# Altium schematic symbol library TI Amplifiers and Linear Special Function Amplifier.SchLib: 708 symbols (part 4 of 34) (continued)
## OPA569AIDWP
designator U?
Power Op Amp, Output Signal Swings within 200 mV of Rails at 2 A Output Current, -55 to 125 degC, 20-pin SOP (DWP20), Green (RoHS & no Sb/Br); Manufacturer: Texas Instruments; PartNumber: OPA569AIDWP; Iq(Max)(mA): 6; Vs(Max)(V): 5.5; Vs(Min)(V): 2.7; DatasheetVersion: SBOS264A; PackageVersion: 4147575/C, 02/2005; PackageReference: DWP20-3905X3265TP; PackageDescription: 20-Pin PowerPAD(TM) Plastic Small-Outline Package, Body 12.825 x 7.52 mm, Pitch 1.27 mm; Supplier 1: Digi-Key; Supplier Part Number 1: 296-14174-5-ND; Supplier 2: Farnell; Supplier Part Number 2: 1470363; Supplier 3: Mouser; Supplier Part Number 3: 595-OPA569AIDWP; Eco-Plan: Green (RoHS & no Sb/Br); Mounting Technology: Surface Mount; ComponentLink1Description: Manufacturer URL; ComponentLink1URL: http://www.ti.com/; ComponentLink2Description: Datasheet; ComponentLink2URL: http://www.ti.com/general/docs/lit/getliterature.tsp?genericPartNumber=OPA569&fileType=pdf; ComponentLink3Description: Package Specification; ComponentLink3URL: http://www.ti.com/litv/pdf/mpds032b
footprint TI-DWP20-3905X3265TP_N (SOP, 20-Leads, Body 12.83x7.52mm, Pitch 1.27mm, Thermal Pad 4.32x3.81mm, IPC Medium Density)
footprint TI-DWP20-3905X3265TP_L (SOP, 20-Leads, Body 12.83x7.52mm, Pitch 1.27mm, Thermal Pad 4.32x3.81mm, IPC High Density)
footprint TI-DWP20-3905X3265TP_M (SOP, 20-Leads, Body 12.83x7.52mm, Pitch 1.27mm, Thermal Pad 4.32x3.81mm, IPC Low Density)
pins: 1 PowerPAD (power) "PowerPAD Connection Pins.", 2 PARALLEL OUT 1 (hiz) "Connection for Paralleling Multiple Amplifiers", 3 CURRENT LIMIT SET (in) "Current Limit Set Pin", 4 ~{CURRENT LIMIT FLAG} (out) "Indicates When Part is in Current Limit (Active LOW).", 5 -IN (in) "Inverting Input", 6 +IN (in) "Noninverting Input", 7 ~{THERMAL FLAG} (out) "Indicates Thermal Stress (Active LOW)", 8 ENABLE (in) "Enabled HIGH. Shut down LOW.", 9 PARALLEL OUT 2 (hiz) "Connection for Paralleling Multiple Amplifiers", 10 PowerPAD (power) "PowerPAD Connection Pins", 11 PowerPAD (power) "PowerPAD Connection Pins", 12 V+ (power) "Positive Power-Supply Voltage", 13 V+ (power) "Positive Power-Supply Voltage", 14 VO (hiz) "Output", 15 VO (hiz) "Output", 16 NC "No Internal Connection", 17 V- (power) "Negative Power-Supply Voltage", 18 V- (power) "Negative Power-Supply Voltage", 19 IMONITOR (in) "Provides 1:475 Bidirectional Copy of Output Current.", 20 PowerPAD (power) "PowerPAD Connection Pins", 21 EP "Exposed pad."

## OPA569AIDWPG4
designator U?
Power Op Amp, Output Signal Swings within 200 mV of Rails at 2 A Output Current, -55 to 125 degC, 20-pin SOP (DWP20), Green (RoHS & no Sb/Br); Manufacturer: Texas Instruments; PartNumber: OPA569AIDWPG4; Iq(Max)(mA): 6; Vs(Max)(V): 5.5; Vs(Min)(V): 2.7; DatasheetVersion: SBOS264A; PackageVersion: 4147575/C, 02/2005; PackageReference: DWP20-3905X3265TP; PackageDescription: 20-Pin PowerPAD(TM) Plastic Small-Outline Package, Body 12.825 x 7.52 mm, Pitch 1.27 mm; Supplier 1: Digi-Key; Supplier Part Number 1: OPA569AIDWPG4-ND; Supplier 2: Farnell; Supplier Part Number 2: 1234786; Supplier 3: Mouser; Supplier Part Number 3: 595-OPA569AIDWPG4; Eco-Plan: Green (RoHS & no Sb/Br); Mounting Technology: Surface Mount; ComponentLink1Description: Manufacturer URL; ComponentLink1URL: http://www.ti.com/; ComponentLink2Description: Datasheet; ComponentLink2URL: http://www.ti.com/general/docs/lit/getliterature.tsp?genericPartNumber=OPA569&fileType=pdf; ComponentLink3Description: Package Specification; ComponentLink3URL: http://www.ti.com/litv/pdf/mpds032b
footprint TI-DWP20-3905X3265TP_N (SOP, 20-Leads, Body 12.83x7.52mm, Pitch 1.27mm, Thermal Pad 4.32x3.81mm, IPC Medium Density)
footprint TI-DWP20-3905X3265TP_L (SOP, 20-Leads, Body 12.83x7.52mm, Pitch 1.27mm, Thermal Pad 4.32x3.81mm, IPC High Density)
footprint TI-DWP20-3905X3265TP_M (SOP, 20-Leads, Body 12.83x7.52mm, Pitch 1.27mm, Thermal Pad 4.32x3.81mm, IPC Low Density)
pins: 1 PowerPAD (power) "PowerPAD Connection Pins.", 2 PARALLEL OUT 1 (hiz) "Connection for Paralleling Multiple Amplifiers", 3 CURRENT LIMIT SET (in) "Current Limit Set Pin", 4 ~{CURRENT LIMIT FLAG} (out) "Indicates When Part is in Current Limit (Active LOW).", 5 -IN (in) "Inverting Input", 6 +IN (in) "Noninverting Input", 7 ~{THERMAL FLAG} (out) "Indicates Thermal Stress (Active LOW)", 8 ENABLE (in) "Enabled HIGH. Shut down LOW.", 9 PARALLEL OUT 2 (hiz) "Connection for Paralleling Multiple Amplifiers", 10 PowerPAD (power) "PowerPAD Connection Pins", 11 PowerPAD (power) "PowerPAD Connection Pins", 12 V+ (power) "Positive Power-Supply Voltage", 13 V+ (power) "Positive Power-Supply Voltage", 14 VO (hiz) "Output", 15 VO (hiz) "Output", 16 NC "No Internal Connection", 17 V- (power) "Negative Power-Supply Voltage", 18 V- (power) "Negative Power-Supply Voltage", 19 IMONITOR (in) "Provides 1:475 Bidirectional Copy of Output Current.", 20 PowerPAD (power) "PowerPAD Connection Pins", 21 EP "Exposed pad."

## OPA569AIDWPR
designator U?
Power Op Amp, Output Signal Swings within 200 mV of Rails at 2 A Output Current, -55 to 125 degC, 20-pin SOP (DWP20), Green (RoHS & no Sb/Br); Manufacturer: Texas Instruments; PartNumber: OPA569AIDWPR; Iq(Max)(mA): 6; Vs(Max)(V): 5.5; Vs(Min)(V): 2.7; DatasheetVersion: SBOS264A; PackageVersion: 4147575/C, 02/2005; PackageReference: DWP20-3905X3265TP; PackageDescription: 20-Pin PowerPAD(TM) Plastic Small-Outline Package, Body 12.825 x 7.52 mm, Pitch 1.27 mm; Supplier 1: Digi-Key; Supplier Part Number 1: 296-26292-2-ND; Supplier 2: Digi-Key; Supplier Part Number 2: 296-26292-1-ND; Supplier 3: Digi-Key; Supplier Part Number 3: 296-26292-6-ND; Supplier 4: Newark; Supplier Part Number 4: 21H3993; Supplier 5: Mouser; Supplier Part Number 5: 595-OPA569AIDWPR; Eco-Plan: Green (RoHS & no Sb/Br); Mounting Technology: Surface Mount; ComponentLink1Description: Manufacturer URL; ComponentLink1URL: http://www.ti.com/; ComponentLink2Description: Datasheet; ComponentLink2URL: http://www.ti.com/general/docs/lit/getliterature.tsp?genericPartNumber=OPA569&fileType=pdf; ComponentLink3Description: Package Specification; ComponentLink3URL: http://www.ti.com/litv/pdf/mpds032b
footprint TI-DWP20-3905X3265TP_N (SOP, 20-Leads, Body 12.83x7.52mm, Pitch 1.27mm, Thermal Pad 4.32x3.81mm, IPC Medium Density)
footprint TI-DWP20-3905X3265TP_L (SOP, 20-Leads, Body 12.83x7.52mm, Pitch 1.27mm, Thermal Pad 4.32x3.81mm, IPC High Density)
footprint TI-DWP20-3905X3265TP_M (SOP, 20-Leads, Body 12.83x7.52mm, Pitch 1.27mm, Thermal Pad 4.32x3.81mm, IPC Low Density)
pins: 1 PowerPAD (power) "PowerPAD Connection Pins.", 2 PARALLEL OUT 1 (hiz) "Connection for Paralleling Multiple Amplifiers", 3 CURRENT LIMIT SET (in) "Current Limit Set Pin", 4 ~{CURRENT LIMIT FLAG} (out) "Indicates When Part is in Current Limit (Active LOW).", 5 -IN (in) "Inverting Input", 6 +IN (in) "Noninverting Input", 7 ~{THERMAL FLAG} (out) "Indicates Thermal Stress (Active LOW)", 8 ENABLE (in) "Enabled HIGH. Shut down LOW.", 9 PARALLEL OUT 2 (hiz) "Connection for Paralleling Multiple Amplifiers", 10 PowerPAD (power) "PowerPAD Connection Pins", 11 PowerPAD (power) "PowerPAD Connection Pins", 12 V+ (power) "Positive Power-Supply Voltage", 13 V+ (power) "Positive Power-Supply Voltage", 14 VO (hiz) "Output", 15 VO (hiz) "Output", 16 NC "No Internal Connection", 17 V- (power) "Negative Power-Supply Voltage", 18 V- (power) "Negative Power-Supply Voltage", 19 IMONITOR (in) "Provides 1:475 Bidirectional Copy of Output Current.", 20 PowerPAD (power) "PowerPAD Connection Pins", 21 EP "Exposed pad."

## OPA569AIDWPRG4
designator U?
Power Op Amp, Output Signal Swings within 200 mV of Rails at 2 A Output Current, -55 to 125 degC, 20-pin SOP (DWP20), Green (RoHS & no Sb/Br); Manufacturer: Texas Instruments; PartNumber: OPA569AIDWPRG4; Iq(Max)(mA): 6; Vs(Max)(V): 5.5; Vs(Min)(V): 2.7; DatasheetVersion: SBOS264A; PackageVersion: 4147575/C, 02/2005; PackageReference: DWP20-3905X3265TP; PackageDescription: 20-Pin PowerPAD(TM) Plastic Small-Outline Package, Body 12.825 x 7.52 mm, Pitch 1.27 mm; Supplier 1: Digi-Key; Supplier Part Number 1: OPA569AIDWPRG4-ND; Supplier 2: Mouser; Supplier Part Number 2: 595-OPA569AIDWPRG4; Eco-Plan: Green (RoHS & no Sb/Br); Mounting Technology: Surface Mount; ComponentLink1Description: Manufacturer URL; ComponentLink1URL: http://www.ti.com/; ComponentLink2Description: Datasheet; ComponentLink2URL: http://www.ti.com/general/docs/lit/getliterature.tsp?genericPartNumber=OPA569&fileType=pdf; ComponentLink3Description: Package Specification; ComponentLink3URL: http://www.ti.com/litv/pdf/mpds032b
footprint TI-DWP20-3905X3265TP_N (SOP, 20-Leads, Body 12.83x7.52mm, Pitch 1.27mm, Thermal Pad 4.32x3.81mm, IPC Medium Density)
footprint TI-DWP20-3905X3265TP_L (SOP, 20-Leads, Body 12.83x7.52mm, Pitch 1.27mm, Thermal Pad 4.32x3.81mm, IPC High Density)
footprint TI-DWP20-3905X3265TP_M (SOP, 20-Leads, Body 12.83x7.52mm, Pitch 1.27mm, Thermal Pad 4.32x3.81mm, IPC Low Density)
pins: 1 PowerPAD (power) "PowerPAD Connection Pins.", 2 PARALLEL OUT 1 (hiz) "Connection for Paralleling Multiple Amplifiers", 3 CURRENT LIMIT SET (in) "Current Limit Set Pin", 4 ~{CURRENT LIMIT FLAG} (out) "Indicates When Part is in Current Limit (Active LOW).", 5 -IN (in) "Inverting Input", 6 +IN (in) "Noninverting Input", 7 ~{THERMAL FLAG} (out) "Indicates Thermal Stress (Active LOW)", 8 ENABLE (in) "Enabled HIGH. Shut down LOW.", 9 PARALLEL OUT 2 (hiz) "Connection for Paralleling Multiple Amplifiers", 10 PowerPAD (power) "PowerPAD Connection Pins", 11 PowerPAD (power) "PowerPAD Connection Pins", 12 V+ (power) "Positive Power-Supply Voltage", 13 V+ (power) "Positive Power-Supply Voltage", 14 VO (hiz) "Output", 15 VO (hiz) "Output", 16 NC "No Internal Connection", 17 V- (power) "Negative Power-Supply Voltage", 18 V- (power) "Negative Power-Supply Voltage", 19 IMONITOR (in) "Provides 1:475 Bidirectional Copy of Output Current.", 20 PowerPAD (power) "PowerPAD Connection Pins", 21 EP "Exposed pad."

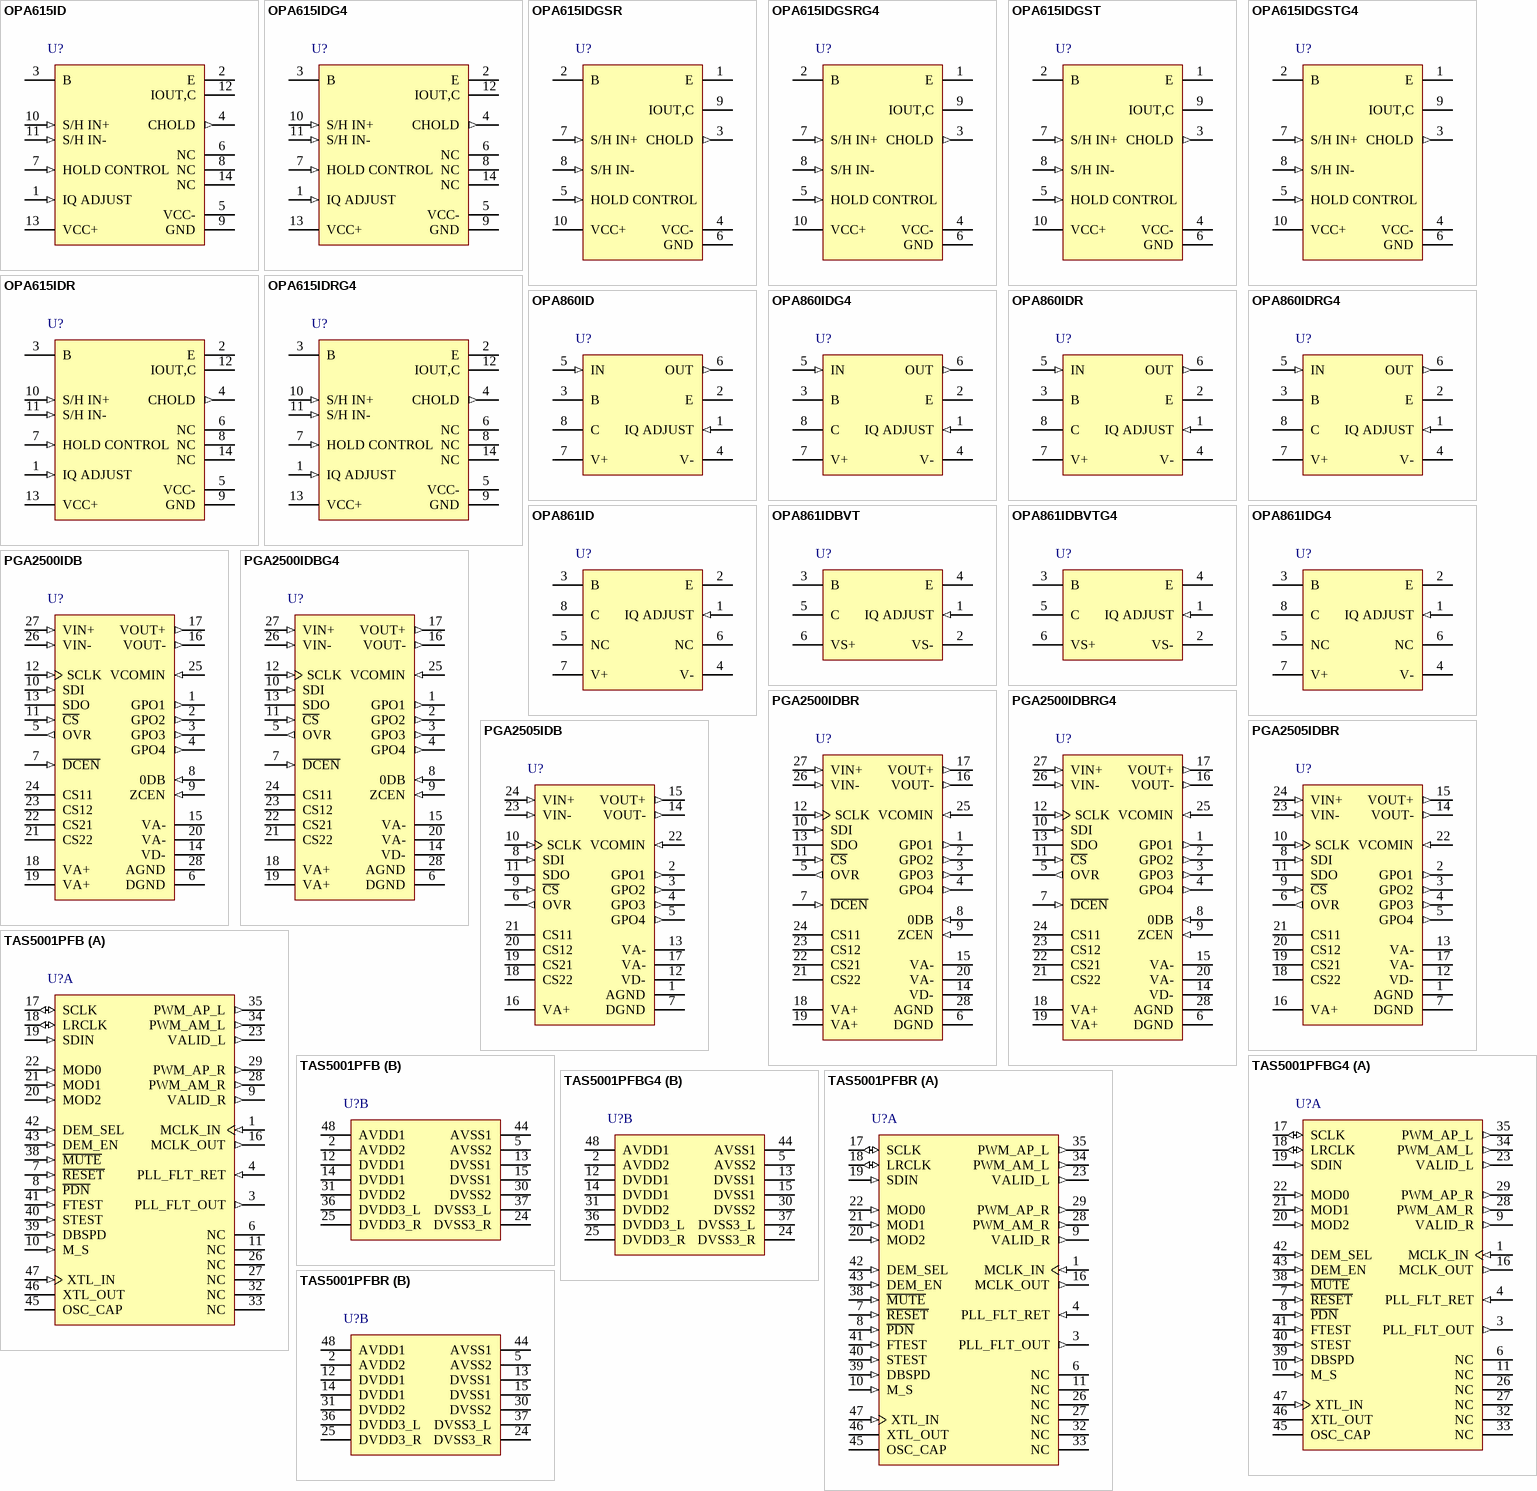
[diagram p5: symbols OPA615ID to TAS5001PFBR]

## OPA615ID
designator U?
Wide Bandwidth, DC Restoration Circuit, -40 to 85 degC, 14-pin SOIC (D14), Green (RoHS & no Sb/Br); Manufacturer: Texas Instruments; PartNumber: OPA615ID; BW @ Acl(MHz): 710; Iib(Max)(nA): 3000; Io(Typ)(mA): 5; Iq per channel(Max)(mA): 13; Number of Channels: 1; Slew Rate(Typ)(V/us): 2500; SubFamily: Transconductance Amplifier; Vio(Max)(mV): 40; Vn at Flatband(Typ)(nV/rtHz): 4.6; Vs(Max)(V): +/-6.2; Vs(Min)(V): +/-4; DatasheetVersion: SBOS299E; PackageVersion: 4040047-5/M, 06/2011; PackageReference: D14; PackageDescription: 14-Pin Plastic Small Outline, Body 8.65 x 3.9 mm, Pitch 1.27 mm; Supplier 1: Digi-Key; Supplier Part Number 1: 296-18291-5-ND; Supplier 2: Newark; Supplier Part Number 2: 52K5807; Supplier 3: Mouser; Supplier Part Number 3: 595-OPA615ID; Eco-Plan: Green (RoHS & no Sb/Br); Mounting Technology: Surface Mount; Code_JEDEC: MS-012; ComponentLink1Description: Manufacturer URL; ComponentLink1URL: http://www.ti.com/; ComponentLink2Description: Datasheet; ComponentLink2URL: http://www.ti.com/general/docs/lit/getliterature.tsp?genericPartNumber=OPA615&fileType=pdf; ComponentLink3Description: Package Specification; ComponentLink3URL: http://www.ti.com/lit/ml/mpds177g/mpds177g.pdf
footprint TI-D14_N (SOIC, 14-Leads, Body 8.75x4mm, Pitch 1.27mm, IPC Medium Density)
footprint TI-D14_L (SOIC, 14-Leads, Body 8.75x4mm, Pitch 1.27mm, IPC High Density)
footprint TI-D14_M (SOIC, 14-Leads, Body 8.75x4mm, Pitch 1.27mm, IPC Low Density)
pins: 1 IQ ADJUST (in), 2 E, 3 B, 4 CHOLD (out), 5 VCC- (power), 6 NC, 7 HOLD CONTROL (in), 8 NC, 9 GND (power), 10 S/H IN+ (in), 11 S/H IN- (in), 12 IOUT,C, 13 VCC+ (power), 14 NC

## OPA615IDG4
designator U?
Wide Bandwidth, DC Restoration Circuit, -40 to 85 degC, 14-pin SOIC (D14), Green (RoHS & no Sb/Br); Manufacturer: Texas Instruments; PartNumber: OPA615IDG4; BW @ Acl(MHz): 710; Iib(Max)(nA): 3000; Io(Typ)(mA): 5; Iq per channel(Max)(mA): 13; Number of Channels: 1; Slew Rate(Typ)(V/us): 2500; SubFamily: Transconductance Amplifier; Vio(Max)(mV): 40; Vn at Flatband(Typ)(nV/rtHz): 4.6; Vs(Max)(V): +/-6.2; Vs(Min)(V): +/-4; DatasheetVersion: SBOS299E; PackageVersion: 4040047-5/M, 06/2011; PackageReference: D14; PackageDescription: 14-Pin Plastic Small Outline, Body 8.65 x 3.9 mm, Pitch 1.27 mm; Supplier 1: Digi-Key; Supplier Part Number 1: OPA615IDG4-ND; Supplier 2: Mouser; Supplier Part Number 2: 595-OPA615IDG4; Eco-Plan: Green (RoHS & no Sb/Br); Mounting Technology: Surface Mount; Code_JEDEC: MS-012; ComponentLink1Description: Manufacturer URL; ComponentLink1URL: http://www.ti.com/; ComponentLink2Description: Datasheet; ComponentLink2URL: http://www.ti.com/general/docs/lit/getliterature.tsp?genericPartNumber=OPA615&fileType=pdf; ComponentLink3Description: Package Specification; ComponentLink3URL: http://www.ti.com/lit/ml/mpds177g/mpds177g.pdf
footprint TI-D14_N (SOIC, 14-Leads, Body 8.75x4mm, Pitch 1.27mm, IPC Medium Density)
footprint TI-D14_L (SOIC, 14-Leads, Body 8.75x4mm, Pitch 1.27mm, IPC High Density)
footprint TI-D14_M (SOIC, 14-Leads, Body 8.75x4mm, Pitch 1.27mm, IPC Low Density)
pins: 1 IQ ADJUST (in), 2 E, 3 B, 4 CHOLD (out), 5 VCC- (power), 6 NC, 7 HOLD CONTROL (in), 8 NC, 9 GND (power), 10 S/H IN+ (in), 11 S/H IN- (in), 12 IOUT,C, 13 VCC+ (power), 14 NC

## OPA615IDGSR
designator U?
Wide Bandwidth, DC Restoration Circuit, -40 to 85 degC, 10-pin SOP (DGS10), Green (RoHS & no Sb/Br); Manufacturer: Texas Instruments; PartNumber: OPA615IDGSR; BW @ Acl(MHz): 710; Iib(Max)(nA): 3000; Io(Typ)(mA): 5; Iq per channel(Max)(mA): 13; Number of Channels: 1; Slew Rate(Typ)(V/us): 2500; SubFamily: Transconductance Amplifier; Vio(Max)(mV): 40; Vn at Flatband(Typ)(nV/rtHz): 4.6; Vs(Max)(V): +/-6.2; Vs(Min)(V): +/-4; DatasheetVersion: SBOS299E; PackageVersion: 4073272/C, 02/2004; PackageReference: DGS10; PackageDescription: 10-Pin Plastic Small Outline, Body 3 x 3 mm, Pitch 0.5 mm; Supplier 1: Digi-Key; Supplier Part Number 1: OPA615IDGSR-ND; Supplier 2: Mouser; Supplier Part Number 2: 595-OPA615IDGSR; Eco-Plan: Green (RoHS & no Sb/Br); Mounting Technology: Surface Mount; Code_JEDEC: MO-153; ComponentLink1Description: Manufacturer URL; ComponentLink1URL: http://www.ti.com/; ComponentLink2Description: Datasheet; ComponentLink2URL: http://www.ti.com/general/docs/lit/getliterature.tsp?genericPartNumber=OPA615&fileType=pdf; ComponentLink3Description: Package Specification; ComponentLink3URL: http://www.ti.com/lit/ml/mpds035b/mpds035b.pdf
footprint TI-DGS10_N (SOP, 10-Leads, Body 3.1x3.1mm, Pitch 0.5mm, IPC Medium Density)
footprint TI-DGS10_L (SOP, 10-Leads, Body 3.1x3.1mm, Pitch 0.5mm, IPC High Density)
footprint TI-DGS10_M (SOP, 10-Leads, Body 3.1x3.1mm, Pitch 0.5mm, IPC Low Density)
pins: 1 E, 2 B, 3 CHOLD (out), 4 VCC- (power), 5 HOLD CONTROL (in), 6 GND (power), 7 S/H IN+ (in), 8 S/H IN- (in), 9 IOUT,C, 10 VCC+ (power)

## OPA615IDGSRG4
designator U?
Wide Bandwidth, DC Restoration Circuit, -40 to 85 degC, 10-pin SOP (DGS10), Green (RoHS & no Sb/Br); Manufacturer: Texas Instruments; PartNumber: OPA615IDGSRG4; BW @ Acl(MHz): 710; Iib(Max)(nA): 3000; Io(Typ)(mA): 5; Iq per channel(Max)(mA): 13; Number of Channels: 1; Slew Rate(Typ)(V/us): 2500; SubFamily: Transconductance Amplifier; Vio(Max)(mV): 40; Vn at Flatband(Typ)(nV/rtHz): 4.6; Vs(Max)(V): +/-6.2; Vs(Min)(V): +/-4; DatasheetVersion: SBOS299E; PackageVersion: 4073272/C, 02/2004; PackageReference: DGS10; PackageDescription: 10-Pin Plastic Small Outline, Body 3 x 3 mm, Pitch 0.5 mm; Supplier 1: Digi-Key; Supplier Part Number 1: OPA615IDGSRG4-ND; Supplier 2: Mouser; Supplier Part Number 2: 595-OPA615IDGSRG4; Eco-Plan: Green (RoHS & no Sb/Br); Mounting Technology: Surface Mount; Code_JEDEC: MO-153; ComponentLink1Description: Manufacturer URL; ComponentLink1URL: http://www.ti.com/; ComponentLink2Description: Datasheet; ComponentLink2URL: http://www.ti.com/general/docs/lit/getliterature.tsp?genericPartNumber=OPA615&fileType=pdf; ComponentLink3Description: Package Specification; ComponentLink3URL: http://www.ti.com/lit/ml/mpds035b/mpds035b.pdf
footprint TI-DGS10_N (SOP, 10-Leads, Body 3.1x3.1mm, Pitch 0.5mm, IPC Medium Density)
footprint TI-DGS10_L (SOP, 10-Leads, Body 3.1x3.1mm, Pitch 0.5mm, IPC High Density)
footprint TI-DGS10_M (SOP, 10-Leads, Body 3.1x3.1mm, Pitch 0.5mm, IPC Low Density)
pins: 1 E, 2 B, 3 CHOLD (out), 4 VCC- (power), 5 HOLD CONTROL (in), 6 GND (power), 7 S/H IN+ (in), 8 S/H IN- (in), 9 IOUT,C, 10 VCC+ (power)

## OPA615IDGST
designator U?
Wide Bandwidth, DC Restoration Circuit, -40 to 85 degC, 10-pin SOP (DGS10), Green (RoHS & no Sb/Br); Manufacturer: Texas Instruments; PartNumber: OPA615IDGST; BW @ Acl(MHz): 710; Iib(Max)(nA): 3000; Io(Typ)(mA): 5; Iq per channel(Max)(mA): 13; Number of Channels: 1; Slew Rate(Typ)(V/us): 2500; SubFamily: Transconductance Amplifier; Vio(Max)(mV): 40; Vn at Flatband(Typ)(nV/rtHz): 4.6; Vs(Max)(V): +/-6.2; Vs(Min)(V): +/-4; DatasheetVersion: SBOS299E; PackageVersion: 4073272/C, 02/2004; PackageReference: DGS10; PackageDescription: 10-Pin Plastic Small Outline, Body 3 x 3 mm, Pitch 0.5 mm; Supplier 1: Digi-Key; Supplier Part Number 1: 296-21396-2-ND; Supplier 2: Digi-Key; Supplier Part Number 2: 296-21396-1-ND; Supplier 3: Digi-Key; Supplier Part Number 3: 296-21396-6-ND; Supplier 4: Newark; Supplier Part Number 4: 27M0450; Supplier 5: Mouser; Supplier Part Number 5: 595-OPA615IDGST; Eco-Plan: Green (RoHS & no Sb/Br); Mounting Technology: Surface Mount; Code_JEDEC: MO-153; ComponentLink1Description: Manufacturer URL; ComponentLink1URL: http://www.ti.com/; ComponentLink2Description: Datasheet; ComponentLink2URL: http://www.ti.com/general/docs/lit/getliterature.tsp?genericPartNumber=OPA615&fileType=pdf; ComponentLink3Description: Package Specification; ComponentLink3URL: http://www.ti.com/lit/ml/mpds035b/mpds035b.pdf
footprint TI-DGS10_N (SOP, 10-Leads, Body 3.1x3.1mm, Pitch 0.5mm, IPC Medium Density)
footprint TI-DGS10_L (SOP, 10-Leads, Body 3.1x3.1mm, Pitch 0.5mm, IPC High Density)
footprint TI-DGS10_M (SOP, 10-Leads, Body 3.1x3.1mm, Pitch 0.5mm, IPC Low Density)
pins: 1 E, 2 B, 3 CHOLD (out), 4 VCC- (power), 5 HOLD CONTROL (in), 6 GND (power), 7 S/H IN+ (in), 8 S/H IN- (in), 9 IOUT,C, 10 VCC+ (power)

## OPA615IDGSTG4
designator U?
Wide Bandwidth, DC Restoration Circuit, -40 to 85 degC, 10-pin SOP (DGS10), Green (RoHS & no Sb/Br); Manufacturer: Texas Instruments; PartNumber: OPA615IDGSTG4; BW @ Acl(MHz): 710; Iib(Max)(nA): 3000; Io(Typ)(mA): 5; Iq per channel(Max)(mA): 13; Number of Channels: 1; Slew Rate(Typ)(V/us): 2500; SubFamily: Transconductance Amplifier; Vio(Max)(mV): 40; Vn at Flatband(Typ)(nV/rtHz): 4.6; Vs(Max)(V): +/-6.2; Vs(Min)(V): +/-4; DatasheetVersion: SBOS299E; PackageVersion: 4073272/C, 02/2004; PackageReference: DGS10; PackageDescription: 10-Pin Plastic Small Outline, Body 3 x 3 mm, Pitch 0.5 mm; Supplier 1: Digi-Key; Supplier Part Number 1: OPA615IDGSTG4-ND; Supplier 2: Mouser; Supplier Part Number 2: 595-OPA615IDGSTG4; Eco-Plan: Green (RoHS & no Sb/Br); Mounting Technology: Surface Mount; Code_JEDEC: MO-153; ComponentLink1Description: Manufacturer URL; ComponentLink1URL: http://www.ti.com/; ComponentLink2Description: Datasheet; ComponentLink2URL: http://www.ti.com/general/docs/lit/getliterature.tsp?genericPartNumber=OPA615&fileType=pdf; ComponentLink3Description: Package Specification; ComponentLink3URL: http://www.ti.com/lit/ml/mpds035b/mpds035b.pdf
footprint TI-DGS10_N (SOP, 10-Leads, Body 3.1x3.1mm, Pitch 0.5mm, IPC Medium Density)
footprint TI-DGS10_L (SOP, 10-Leads, Body 3.1x3.1mm, Pitch 0.5mm, IPC High Density)
footprint TI-DGS10_M (SOP, 10-Leads, Body 3.1x3.1mm, Pitch 0.5mm, IPC Low Density)
pins: 1 E, 2 B, 3 CHOLD (out), 4 VCC- (power), 5 HOLD CONTROL (in), 6 GND (power), 7 S/H IN+ (in), 8 S/H IN- (in), 9 IOUT,C, 10 VCC+ (power)

## OPA615IDR
designator U?
Wide Bandwidth, DC Restoration Circuit, -40 to 85 degC, 14-pin SOIC (D14), Green (RoHS & no Sb/Br); Manufacturer: Texas Instruments; PartNumber: OPA615IDR; BW @ Acl(MHz): 710; Iib(Max)(nA): 3000; Io(Typ)(mA): 5; Iq per channel(Max)(mA): 13; Number of Channels: 1; Slew Rate(Typ)(V/us): 2500; SubFamily: Transconductance Amplifier; Vio(Max)(mV): 40; Vn at Flatband(Typ)(nV/rtHz): 4.6; Vs(Max)(V): +/-6.2; Vs(Min)(V): +/-4; DatasheetVersion: SBOS299E; PackageVersion: 4040047-5/M, 06/2011; PackageReference: D14; PackageDescription: 14-Pin Plastic Small Outline, Body 8.65 x 3.9 mm, Pitch 1.27 mm; Supplier 1: Digi-Key; Supplier Part Number 1: OPA615IDR-ND; Supplier 2: Newark; Supplier Part Number 2: 52K5808; Supplier 3: Mouser; Supplier Part Number 3: 595-OPA615IDR; Eco-Plan: Green (RoHS & no Sb/Br); Mounting Technology: Surface Mount; Code_JEDEC: MS-012; ComponentLink1Description: Manufacturer URL; ComponentLink1URL: http://www.ti.com/; ComponentLink2Description: Datasheet; ComponentLink2URL: http://www.ti.com/general/docs/lit/getliterature.tsp?genericPartNumber=OPA615&fileType=pdf; ComponentLink3Description: Package Specification; ComponentLink3URL: http://www.ti.com/lit/ml/mpds177g/mpds177g.pdf
footprint TI-D14_N (SOIC, 14-Leads, Body 8.75x4mm, Pitch 1.27mm, IPC Medium Density)
footprint TI-D14_L (SOIC, 14-Leads, Body 8.75x4mm, Pitch 1.27mm, IPC High Density)
footprint TI-D14_M (SOIC, 14-Leads, Body 8.75x4mm, Pitch 1.27mm, IPC Low Density)
pins: 1 IQ ADJUST (in), 2 E, 3 B, 4 CHOLD (out), 5 VCC- (power), 6 NC, 7 HOLD CONTROL (in), 8 NC, 9 GND (power), 10 S/H IN+ (in), 11 S/H IN- (in), 12 IOUT,C, 13 VCC+ (power), 14 NC

## OPA615IDRG4
designator U?
Wide Bandwidth, DC Restoration Circuit, -40 to 85 degC, 14-pin SOIC (D14), Green (RoHS & no Sb/Br); Manufacturer: Texas Instruments; PartNumber: OPA615IDRG4; BW @ Acl(MHz): 710; Iib(Max)(nA): 3000; Io(Typ)(mA): 5; Iq per channel(Max)(mA): 13; Number of Channels: 1; Slew Rate(Typ)(V/us): 2500; SubFamily: Transconductance Amplifier; Vio(Max)(mV): 40; Vn at Flatband(Typ)(nV/rtHz): 4.6; Vs(Max)(V): +/-6.2; Vs(Min)(V): +/-4; DatasheetVersion: SBOS299E; PackageVersion: 4040047-5/M, 06/2011; PackageReference: D14; PackageDescription: 14-Pin Plastic Small Outline, Body 8.65 x 3.9 mm, Pitch 1.27 mm; Supplier 1: Digi-Key; Supplier Part Number 1: OPA615IDRG4-ND; Supplier 2: Mouser; Supplier Part Number 2: 595-OPA615IDRG4; Eco-Plan: Green (RoHS & no Sb/Br); Mounting Technology: Surface Mount; Code_JEDEC: MS-012; ComponentLink1Description: Manufacturer URL; ComponentLink1URL: http://www.ti.com/; ComponentLink2Description: Datasheet; ComponentLink2URL: http://www.ti.com/general/docs/lit/getliterature.tsp?genericPartNumber=OPA615&fileType=pdf; ComponentLink3Description: Package Specification; ComponentLink3URL: http://www.ti.com/lit/ml/mpds177g/mpds177g.pdf
footprint TI-D14_N (SOIC, 14-Leads, Body 8.75x4mm, Pitch 1.27mm, IPC Medium Density)
footprint TI-D14_L (SOIC, 14-Leads, Body 8.75x4mm, Pitch 1.27mm, IPC High Density)
footprint TI-D14_M (SOIC, 14-Leads, Body 8.75x4mm, Pitch 1.27mm, IPC Low Density)
pins: 1 IQ ADJUST (in), 2 E, 3 B, 4 CHOLD (out), 5 VCC- (power), 6 NC, 7 HOLD CONTROL (in), 8 NC, 9 GND (power), 10 S/H IN+ (in), 11 S/H IN- (in), 12 IOUT,C, 13 VCC+ (power), 14 NC

## OPA860ID
designator U?
Wide Bandwidth Operational Transconductance Amplifier and Buffer, -40 to 85 degC, 8-pin SOIC (D8), Green (RoHS & no Sb/Br); Manufacturer: Texas Instruments; PartNumber: OPA860ID; Acl, min stable gain(V/V): 1; BW @ Acl(MHz): 80; Iib(Max)(nA): 5000; Io(Typ)(mA): 15; Iq per channel(Max)(mA): 12; Slew Rate(Typ)(V/us): 900; Vn at Flatband(Typ)(nV/rtHz): 2.4; Vs(Max)(V): 13; Vs(Min)(V): 5; DatasheetVersion: SBOS331C; PackageVersion: 4040047-3/M, 06/2011; PackageReference: D8; PackageDescription: 8-Pin Plastic Small Outline, Body 4.9 x 3.9 mm, Pitch 1.27 mm; Supplier 1: Digi-Key; Supplier Part Number 1: 296-18202-ND; Supplier 2: Farnell; Supplier Part Number 2: 1180132; Supplier 3: Newark; Supplier Part Number 3: 26M1915; Supplier 4: Newark; Supplier Part Number 4: 43K4044; Supplier 5: Mouser; Supplier Part Number 5: 595-OPA860ID; Eco-Plan: Green (RoHS & no Sb/Br); Number of Channels: 1; SubFamily: Transconductance Amplifier; Vio(Max)(mV): 12; Mounting Technology: Surface Mount; Code_JEDEC: MS-012; ComponentLink1Description: Manufacturer URL; ComponentLink1URL: http://www.ti.com/; ComponentLink2Description: Datasheet; ComponentLink2URL: http://www.ti.com/general/docs/lit/getliterature.tsp?genericPartNumber=OPA860&fileType=pdf; ComponentLink3Description: Package Specification; ComponentLink3URL: http://www.ti.com/litv/pdf/msoi002j
footprint TI-D8_N (SOIC, 8-Leads, Body 5x4mm, Pitch 1.27mm, IPC Medium Density)
footprint TI-D8_L (SOIC, 8-Leads, Body 5x4mm, Pitch 1.27mm, IPC High Density)
footprint TI-D8_M (SOIC, 8-Leads, Body 5x4mm, Pitch 1.27mm, IPC Low Density)
pins: 1 IQ ADJUST (in), 2 E, 3 B, 4 V- (power), 5 IN (in), 6 OUT (out), 7 V+ (power), 8 C

## OPA860IDG4
designator U?
Wide Bandwidth Operational Transconductance Amplifier and Buffer, -40 to 85 degC, 8-pin SOIC (D8), Green (RoHS & no Sb/Br); Manufacturer: Texas Instruments; PartNumber: OPA860IDG4; Acl, min stable gain(V/V): 1; BW @ Acl(MHz): 80; Iib(Max)(nA): 5000; Io(Typ)(mA): 15; Iq per channel(Max)(mA): 12; Slew Rate(Typ)(V/us): 900; Vn at Flatband(Typ)(nV/rtHz): 2.4; Vs(Max)(V): 13; Vs(Min)(V): 5; DatasheetVersion: SBOS331C; PackageVersion: 4040047-3/M, 06/2011; PackageReference: D8; PackageDescription: 8-Pin Plastic Small Outline, Body 4.9 x 3.9 mm, Pitch 1.27 mm; Supplier 1: Digi-Key; Supplier Part Number 1: OPA860IDG4-ND; Supplier 2: Mouser; Supplier Part Number 2: 595-OPA860IDG4; Eco-Plan: Green (RoHS & no Sb/Br); Number of Channels: 1; SubFamily: Transconductance Amplifier; Vio(Max)(mV): 12; Mounting Technology: Surface Mount; Code_JEDEC: MS-012; ComponentLink1Description: Manufacturer URL; ComponentLink1URL: http://www.ti.com/; ComponentLink2Description: Datasheet; ComponentLink2URL: http://www.ti.com/general/docs/lit/getliterature.tsp?genericPartNumber=OPA860&fileType=pdf; ComponentLink3Description: Package Specification; ComponentLink3URL: http://www.ti.com/litv/pdf/msoi002j
footprint TI-D8_N (SOIC, 8-Leads, Body 5x4mm, Pitch 1.27mm, IPC Medium Density)
footprint TI-D8_L (SOIC, 8-Leads, Body 5x4mm, Pitch 1.27mm, IPC High Density)
footprint TI-D8_M (SOIC, 8-Leads, Body 5x4mm, Pitch 1.27mm, IPC Low Density)
pins: 1 IQ ADJUST (in), 2 E, 3 B, 4 V- (power), 5 IN (in), 6 OUT (out), 7 V+ (power), 8 C

## OPA860IDR
designator U?
Wide Bandwidth Operational Transconductance Amplifier and Buffer, -40 to 85 degC, 8-pin SOIC (D8), Green (RoHS & no Sb/Br); Manufacturer: Texas Instruments; PartNumber: OPA860IDR; Acl, min stable gain(V/V): 1; BW @ Acl(MHz): 80; Iib(Max)(nA): 5000; Io(Typ)(mA): 15; Iq per channel(Max)(mA): 12; Slew Rate(Typ)(V/us): 900; Vn at Flatband(Typ)(nV/rtHz): 2.4; Vs(Max)(V): 13; Vs(Min)(V): 5; DatasheetVersion: SBOS331C; PackageVersion: 4040047-3/M, 06/2011; PackageReference: D8; PackageDescription: 8-Pin Plastic Small Outline, Body 4.9 x 3.9 mm, Pitch 1.27 mm; Supplier 1: Digi-Key; Supplier Part Number 1: OPA860IDR-ND; Supplier 2: Mouser; Supplier Part Number 2: 595-OPA860IDR; Eco-Plan: Green (RoHS & no Sb/Br); Number of Channels: 1; SubFamily: Transconductance Amplifier; Vio(Max)(mV): 12; Mounting Technology: Surface Mount; Code_JEDEC: MS-012; ComponentLink1Description: Manufacturer URL; ComponentLink1URL: http://www.ti.com/; ComponentLink2Description: Datasheet; ComponentLink2URL: http://www.ti.com/general/docs/lit/getliterature.tsp?genericPartNumber=OPA860&fileType=pdf; ComponentLink3Description: Package Specification; ComponentLink3URL: http://www.ti.com/litv/pdf/msoi002j
footprint TI-D8_N (SOIC, 8-Leads, Body 5x4mm, Pitch 1.27mm, IPC Medium Density)
footprint TI-D8_L (SOIC, 8-Leads, Body 5x4mm, Pitch 1.27mm, IPC High Density)
footprint TI-D8_M (SOIC, 8-Leads, Body 5x4mm, Pitch 1.27mm, IPC Low Density)
pins: 1 IQ ADJUST (in), 2 E, 3 B, 4 V- (power), 5 IN (in), 6 OUT (out), 7 V+ (power), 8 C

## OPA860IDRG4
designator U?
Wide Bandwidth Operational Transconductance Amplifier and Buffer, -40 to 85 degC, 8-pin SOIC (D8), Green (RoHS & no Sb/Br); Manufacturer: Texas Instruments; PartNumber: OPA860IDRG4; Acl, min stable gain(V/V): 1; BW @ Acl(MHz): 80; Iib(Max)(nA): 5000; Io(Typ)(mA): 15; Iq per channel(Max)(mA): 12; Slew Rate(Typ)(V/us): 900; Vn at Flatband(Typ)(nV/rtHz): 2.4; Vs(Max)(V): 13; Vs(Min)(V): 5; DatasheetVersion: SBOS331C; PackageVersion: 4040047-3/M, 06/2011; PackageReference: D8; PackageDescription: 8-Pin Plastic Small Outline, Body 4.9 x 3.9 mm, Pitch 1.27 mm; Supplier 1: Digi-Key; Supplier Part Number 1: OPA860IDRG4-ND; Supplier 2: Mouser; Supplier Part Number 2: 595-OPA860IDRG4; Eco-Plan: Green (RoHS & no Sb/Br); Number of Channels: 1; SubFamily: Transconductance Amplifier; Vio(Max)(mV): 12; Mounting Technology: Surface Mount; Code_JEDEC: MS-012; ComponentLink1Description: Manufacturer URL; ComponentLink1URL: http://www.ti.com/; ComponentLink2Description: Datasheet; ComponentLink2URL: http://www.ti.com/general/docs/lit/getliterature.tsp?genericPartNumber=OPA860&fileType=pdf; ComponentLink3Description: Package Specification; ComponentLink3URL: http://www.ti.com/litv/pdf/msoi002j
footprint TI-D8_N (SOIC, 8-Leads, Body 5x4mm, Pitch 1.27mm, IPC Medium Density)
footprint TI-D8_L (SOIC, 8-Leads, Body 5x4mm, Pitch 1.27mm, IPC High Density)
footprint TI-D8_M (SOIC, 8-Leads, Body 5x4mm, Pitch 1.27mm, IPC Low Density)
pins: 1 IQ ADJUST (in), 2 E, 3 B, 4 V- (power), 5 IN (in), 6 OUT (out), 7 V+ (power), 8 C

## OPA861ID
designator U?
Wide Bandwidth Operational Transconductance Amplifier, -40 to 85 degC, 8-pin SOIC (D8), Green (RoHS & no Sb/Br); Manufacturer: Texas Instruments; PartNumber: OPA861ID; BW @ Acl(MHz): 80; Iib(Max)(nA): 5000; Io(Typ)(mA): 15; Iq per channel(Max)(mA): 5.9; Number of Channels: 1; Slew Rate(Typ)(V/us): 900; Vio(Max)(mV): 12; Vn at Flatband(Typ)(nV/rtHz): 2.4; Vs(Max)(V): 12.6; Vs(Min)(V): 4; DatasheetVersion: SBOS338G; PackageVersion: 4040047-3/M, 06/2011; PackageReference: D8; PackageDescription: 8-Pin Plastic Small Outline, Body 4.9 x 3.9 mm, Pitch 1.27 mm; Supplier 1: Digi-Key; Supplier Part Number 1: 296-18699-5-ND; Supplier 2: Farnell; Supplier Part Number 2: 1180133; Supplier 3: Newark; Supplier Part Number 3: 26M1916; Supplier 4: Newark; Supplier Part Number 4: 61K1377; Supplier 5: Mouser; Supplier Part Number 5: 595-OPA861ID; Eco-Plan: Green (RoHS & no Sb/Br); SubFamily: Transconductance Amplifier; Mounting Technology: Surface Mount; Code_JEDEC: MS-012; ComponentLink1Description: Manufacturer URL; ComponentLink1URL: http://www.ti.com/; ComponentLink2Description: Datasheet; ComponentLink2URL: http://www.ti.com/general/docs/lit/getliterature.tsp?genericPartNumber=OPA861&fileType=pdf; ComponentLink3Description: Package Specification; ComponentLink3URL: http://www.ti.com/litv/pdf/msoi002j
footprint TI-D8_N (SOIC, 8-Leads, Body 5x4mm, Pitch 1.27mm, IPC Medium Density)
footprint TI-D8_L (SOIC, 8-Leads, Body 5x4mm, Pitch 1.27mm, IPC High Density)
footprint TI-D8_M (SOIC, 8-Leads, Body 5x4mm, Pitch 1.27mm, IPC Low Density)
pins: 1 IQ ADJUST (in), 2 E, 3 B, 4 V- (power), 5 NC, 6 NC, 7 V+ (power), 8 C

## OPA861IDBVT
designator U?
Wide Bandwidth Operational Transconductance Amplifier, -40 to 85 degC, 6-pin SOT23 (DBV6), Green (RoHS & no Sb/Br); Manufacturer: Texas Instruments; PartNumber: OPA861IDBVT; BW @ Acl(MHz): 80; Iib(Max)(nA): 5000; Io(Typ)(mA): 15; Iq per channel(Max)(mA): 5.9; Number of Channels: 1; Slew Rate(Typ)(V/us): 900; Vio(Max)(mV): 12; Vn at Flatband(Typ)(nV/rtHz): 2.4; Vs(Max)(V): 12.6; Vs(Min)(V): 4; DatasheetVersion: SBOS338G; PackageVersion: 4073253-5/K, 03/2006; PackageReference: DBV6; PackageDescription: 6-Pin Plastic Small Outline, Body 1.6 x 2.9 mm, Pitch 0.95 mm; Supplier 1: Digi-Key; Supplier Part Number 1: 296-18700-2-ND; Supplier 2: Digi-Key; Supplier Part Number 2: 296-18700-1-ND; Supplier 3: Digi-Key; Supplier Part Number 3: 296-18700-6-ND; Supplier 4: Mouser; Supplier Part Number 4: 595-OPA861IDBVT; Eco-Plan: Green (RoHS & no Sb/Br); SubFamily: Transconductance Amplifier; Mounting Technology: Surface Mount; Code_JEDEC: MO-178; ComponentLink1Description: Manufacturer URL; ComponentLink1URL: http://www.ti.com/; ComponentLink2Description: Datasheet; ComponentLink2URL: http://www.ti.com/general/docs/lit/getliterature.tsp?genericPartNumber=OPA861&fileType=pdf; ComponentLink3Description: Package Specification; ComponentLink3URL: http://www.ti.com/litv/pdf/mpds026h
footprint TI-DBV6_N (SOT23, 6-Leads, Body 3.05x1.75mm, Pitch 0.95mm, IPC Medium Density)
footprint TI-DBV6_L (SOT23, 6-Leads, Body 3.05x1.75mm, Pitch 0.95mm, IPC High Density)
footprint TI-DBV6_M (SOT23, 6-Leads, Body 3.05x1.75mm, Pitch 0.95mm, IPC Low Density)
pins: 1 IQ ADJUST (in), 2 VS- (power), 3 B, 4 E, 5 C, 6 VS+ (power)

## OPA861IDBVTG4
designator U?
Wide Bandwidth Operational Transconductance Amplifier, -40 to 85 degC, 6-pin SOT23 (DBV6), Green (RoHS & no Sb/Br); Manufacturer: Texas Instruments; PartNumber: OPA861IDBVTG4; BW @ Acl(MHz): 80; Iib(Max)(nA): 5000; Io(Typ)(mA): 15; Iq per channel(Max)(mA): 5.9; Number of Channels: 1; Slew Rate(Typ)(V/us): 900; Vio(Max)(mV): 12; Vn at Flatband(Typ)(nV/rtHz): 2.4; Vs(Max)(V): 12.6; Vs(Min)(V): 4; DatasheetVersion: SBOS338G; PackageVersion: 4073253-5/K, 03/2006; PackageReference: DBV6; PackageDescription: 6-Pin Plastic Small Outline, Body 1.6 x 2.9 mm, Pitch 0.95 mm; Supplier 1: Digi-Key; Supplier Part Number 1: OPA861IDBVTG4-ND; Supplier 2: Newark; Supplier Part Number 2: 33M9473; Supplier 3: Mouser; Supplier Part Number 3: 595-OPA861IDBVTG4; Eco-Plan: Green (RoHS & no Sb/Br); SubFamily: Transconductance Amplifier; Mounting Technology: Surface Mount; Code_JEDEC: MO-178; ComponentLink1Description: Manufacturer URL; ComponentLink1URL: http://www.ti.com/; ComponentLink2Description: Datasheet; ComponentLink2URL: http://www.ti.com/general/docs/lit/getliterature.tsp?genericPartNumber=OPA861&fileType=pdf; ComponentLink3Description: Package Specification; ComponentLink3URL: http://www.ti.com/litv/pdf/mpds026h
footprint TI-DBV6_N (SOT23, 6-Leads, Body 3.05x1.75mm, Pitch 0.95mm, IPC Medium Density)
footprint TI-DBV6_L (SOT23, 6-Leads, Body 3.05x1.75mm, Pitch 0.95mm, IPC High Density)
footprint TI-DBV6_M (SOT23, 6-Leads, Body 3.05x1.75mm, Pitch 0.95mm, IPC Low Density)
pins: 1 IQ ADJUST (in), 2 VS- (power), 3 B, 4 E, 5 C, 6 VS+ (power)

## OPA861IDG4
designator U?
Wide Bandwidth Operational Transconductance Amplifier, -40 to 85 degC, 8-pin SOIC (D8), Green (RoHS & no Sb/Br); Manufacturer: Texas Instruments; PartNumber: OPA861IDG4; BW @ Acl(MHz): 80; Iib(Max)(nA): 5000; Io(Typ)(mA): 15; Iq per channel(Max)(mA): 5.9; Number of Channels: 1; Slew Rate(Typ)(V/us): 900; Vio(Max)(mV): 12; Vn at Flatband(Typ)(nV/rtHz): 2.4; Vs(Max)(V): 12.6; Vs(Min)(V): 4; DatasheetVersion: SBOS338G; PackageVersion: 4040047-3/M, 06/2011; PackageReference: D8; PackageDescription: 8-Pin Plastic Small Outline, Body 4.9 x 3.9 mm, Pitch 1.27 mm; Supplier 1: Digi-Key; Supplier Part Number 1: OPA861IDG4-ND; Supplier 2: Mouser; Supplier Part Number 2: 595-OPA861IDG4; Eco-Plan: Green (RoHS & no Sb/Br); SubFamily: Transconductance Amplifier; Mounting Technology: Surface Mount; Code_JEDEC: MS-012; ComponentLink1Description: Manufacturer URL; ComponentLink1URL: http://www.ti.com/; ComponentLink2Description: Datasheet; ComponentLink2URL: http://www.ti.com/general/docs/lit/getliterature.tsp?genericPartNumber=OPA861&fileType=pdf; ComponentLink3Description: Package Specification; ComponentLink3URL: http://www.ti.com/litv/pdf/msoi002j
footprint TI-D8_N (SOIC, 8-Leads, Body 5x4mm, Pitch 1.27mm, IPC Medium Density)
footprint TI-D8_L (SOIC, 8-Leads, Body 5x4mm, Pitch 1.27mm, IPC High Density)
footprint TI-D8_M (SOIC, 8-Leads, Body 5x4mm, Pitch 1.27mm, IPC Low Density)
pins: 1 IQ ADJUST (in), 2 E, 3 B, 4 V- (power), 5 NC, 6 NC, 7 V+ (power), 8 C

## PGA2500IDB
designator U?
Gain Range: 0 dB, and 10 dB to 65 dB in 1 dB Steps, -40 to 85 degC, 28-pin SOP (DB28), Green (RoHS & no Sb/Br); Manufacturer: Texas Instruments; PartNumber: PGA2500IDB; Equivalent Input Noise (EIN) withGain: 30dB(dB)=-128; Input Type: Fully Differential; Quiescent Current (+/-)(Typ)(mA): 30; SubFamily: Microphone Preamplifier; THD+N with Gain: 30dB(percent)=0.0004; Vmax(V): 5.25; Vmin(V): 4.75; DatasheetVersion: SBOS289A; PackageVersion: 4040065/E, 12/2001; PackageReference: DB28; PackageDescription: 28-Pin Plastic Small Outline, Body 10.2 X 5.3 mm, Pitch 0.65 mm; Supplier 1: Digi-Key; Supplier Part Number 1: 296-16674-5-ND; Supplier 2: Farnell; Supplier Part Number 2: 2119099; Supplier 3: Newark; Supplier Part Number 3: 36K7585; Supplier 4: Mouser; Supplier Part Number 4: 595-PGA2500IDB; Eco-Plan: Green (RoHS & no Sb/Br); Gain Range(dB): 0dB, and 10dB to 65dB in 1dB steps; Mounting Technology: Surface Mount; Code_JEDEC: MO-150; ComponentLink1Description: Manufacturer URL; ComponentLink1URL: http://www.ti.com/; ComponentLink2Description: Datasheet; ComponentLink2URL: http://www.ti.com/general/docs/lit/getliterature.tsp?genericPartNumber=PGA2500&fileType=pdf; ComponentLink3Description: Package Specification; ComponentLink3URL: http://www.ti.com/lit/ml/msso002e/msso002e.pdf
footprint TI-DB28_N (SOP, 28-Leads, Body 10.2x5.3mm, Pitch 0.65mm, IPC Medium Density)
footprint TI-DB28_L (SOP, 28-Leads, Body 10.2x5.3mm, Pitch 0.65mm, IPC High Density)
footprint TI-DB28_M (SOP, 28-Leads, Body 10.2x5.3mm, Pitch 0.65mm, IPC Low Density)
pins: 1 GPO1 (out) "General-Purpose CMOS Logic Output", 2 GPO2 (out) "General-Purpose CMOS Logic Output", 3 GPO3 (out) "General-Purpose CMOS Logic Output", 4 GPO4 (out) "General-Purpose CMOS Logic Output", 5 OVR (out) "Over Range Output (Active High)", 6 DGND (power) "Digital Ground", 7 ~{DCEN} (in) "DC Servo Enable (Active Low)", 8 0DB (in) "Unity Gain Enable (Active High)", 9 ZCEN (in) "Zero Crossing Detector Enable (Active High)", 10 SDI (in) "Serial Data Input", 11 ~{CS} (in) "Chip Select Input (Active Low)", 12 SCLK (in) "Serial Data Clock Input", 13 SDO (hiz) "Serial Data Output", 14 VD- (power) "-5V Digital Supply", 15 VA- (power) "-5V Analog Supply", 16 VOUT- (out) "Analog Output, Inverting", 17 VOUT+ (out) "Analog Output, Non-Inverting", 18 VA+ (power) "+5V Analog Supply", 19 VA+ (power) "+5V Analog Supply", 20 VA- (power) "-5V Analog Supply", 21 CS22 "DC Servo Capacitor #2, Terminal 2", 22 CS21 "DC Servo Capacitor #2, Terminal 1", 23 CS12 "DC Servo Capacitor #1, Terminal 2", 24 CS11 "DC Servo Capacitor #1, Terminal 1", 25 VCOMIN (in) "Common Mode Voltage Input, 0V to +2.5V", 26 VIN- (in) "Analog Input, Inverting", 27 VIN+ (in) "Analog Input, Noninverting", 28 AGND (power) "Analog Ground"

## PGA2500IDBG4
designator U?
Gain Range: 0 dB, and 10 dB to 65 dB in 1 dB Steps, -40 to 85 degC, 28-pin SOP (DB28), Green (RoHS & no Sb/Br); Manufacturer: Texas Instruments; PartNumber: PGA2500IDBG4; Equivalent Input Noise (EIN) withGain: 30dB(dB)=-128; Input Type: Fully Differential; Quiescent Current (+/-)(Typ)(mA): 30; SubFamily: Microphone Preamplifier; THD+N with Gain: 30dB(percent)=0.0004; Vmax(V): 5.25; Vmin(V): 4.75; DatasheetVersion: SBOS289A; PackageVersion: 4040065/E, 12/2001; PackageReference: DB28; PackageDescription: 28-Pin Plastic Small Outline, Body 10.2 X 5.3 mm, Pitch 0.65 mm; Supplier 1: Digi-Key; Supplier Part Number 1: PGA2500IDBG4-ND; Supplier 2: Farnell; Supplier Part Number 2: 1180156; Supplier 3: Newark; Supplier Part Number 3: 26M1946; Supplier 4: Newark; Supplier Part Number 4: 24K4716; Supplier 5: Mouser; Supplier Part Number 5: 595-PGA2500IDBG4; Eco-Plan: Green (RoHS & no Sb/Br); Gain Range(dB): 0dB, and 10dB to 65dB in 1dB steps; Mounting Technology: Surface Mount; Code_JEDEC: MO-150; ComponentLink1Description: Manufacturer URL; ComponentLink1URL: http://www.ti.com/; ComponentLink2Description: Datasheet; ComponentLink2URL: http://www.ti.com/general/docs/lit/getliterature.tsp?genericPartNumber=PGA2500&fileType=pdf; ComponentLink3Description: Package Specification; ComponentLink3URL: http://www.ti.com/lit/ml/msso002e/msso002e.pdf
footprint TI-DB28_N (SOP, 28-Leads, Body 10.2x5.3mm, Pitch 0.65mm, IPC Medium Density)
footprint TI-DB28_L (SOP, 28-Leads, Body 10.2x5.3mm, Pitch 0.65mm, IPC High Density)
footprint TI-DB28_M (SOP, 28-Leads, Body 10.2x5.3mm, Pitch 0.65mm, IPC Low Density)
pins: 1 GPO1 (out) "General-Purpose CMOS Logic Output", 2 GPO2 (out) "General-Purpose CMOS Logic Output", 3 GPO3 (out) "General-Purpose CMOS Logic Output", 4 GPO4 (out) "General-Purpose CMOS Logic Output", 5 OVR (out) "Over Range Output (Active High)", 6 DGND (power) "Digital Ground", 7 ~{DCEN} (in) "DC Servo Enable (Active Low)", 8 0DB (in) "Unity Gain Enable (Active High)", 9 ZCEN (in) "Zero Crossing Detector Enable (Active High)", 10 SDI (in) "Serial Data Input", 11 ~{CS} (in) "Chip Select Input (Active Low)", 12 SCLK (in) "Serial Data Clock Input", 13 SDO (hiz) "Serial Data Output", 14 VD- (power) "-5V Digital Supply", 15 VA- (power) "-5V Analog Supply", 16 VOUT- (out) "Analog Output, Inverting", 17 VOUT+ (out) "Analog Output, Non-Inverting", 18 VA+ (power) "+5V Analog Supply", 19 VA+ (power) "+5V Analog Supply", 20 VA- (power) "-5V Analog Supply", 21 CS22 "DC Servo Capacitor #2, Terminal 2", 22 CS21 "DC Servo Capacitor #2, Terminal 1", 23 CS12 "DC Servo Capacitor #1, Terminal 2", 24 CS11 "DC Servo Capacitor #1, Terminal 1", 25 VCOMIN (in) "Common Mode Voltage Input, 0V to +2.5V", 26 VIN- (in) "Analog Input, Inverting", 27 VIN+ (in) "Analog Input, Noninverting", 28 AGND (power) "Analog Ground"

## PGA2500IDBR
designator U?
Gain Range: 0 dB, and 10 dB to 65 dB in 1 dB Steps, -40 to 85 degC, 28-pin SOP (DB28), Green (RoHS & no Sb/Br); Manufacturer: Texas Instruments; PartNumber: PGA2500IDBR; Equivalent Input Noise (EIN) withGain: 30dB(dB)=-128; Input Type: Fully Differential; Quiescent Current (+/-)(Typ)(mA): 30; SubFamily: Microphone Preamplifier; THD+N with Gain: 30dB(percent)=0.0004; Vmax(V): 5.25; Vmin(V): 4.75; DatasheetVersion: SBOS289A; PackageVersion: 4040065/E, 12/2001; PackageReference: DB28; PackageDescription: 28-Pin Plastic Small Outline, Body 10.2 X 5.3 mm, Pitch 0.65 mm; Supplier 1: Digi-Key; Supplier Part Number 1: PGA2500IDBR-ND; Supplier 2: Newark; Supplier Part Number 2: 90H2305; Supplier 3: Mouser; Supplier Part Number 3: 595-PGA2500IDBR; Eco-Plan: Green (RoHS & no Sb/Br); Gain Range(dB): 0dB, and 10dB to 65dB in 1dB steps; Mounting Technology: Surface Mount; Code_JEDEC: MO-150; ComponentLink1Description: Manufacturer URL; ComponentLink1URL: http://www.ti.com/; ComponentLink2Description: Datasheet; ComponentLink2URL: http://www.ti.com/general/docs/lit/getliterature.tsp?genericPartNumber=PGA2500&fileType=pdf; ComponentLink3Description: Package Specification; ComponentLink3URL: http://www.ti.com/lit/ml/msso002e/msso002e.pdf
footprint TI-DB28_N (SOP, 28-Leads, Body 10.2x5.3mm, Pitch 0.65mm, IPC Medium Density)
footprint TI-DB28_L (SOP, 28-Leads, Body 10.2x5.3mm, Pitch 0.65mm, IPC High Density)
footprint TI-DB28_M (SOP, 28-Leads, Body 10.2x5.3mm, Pitch 0.65mm, IPC Low Density)
pins: 1 GPO1 (out) "General-Purpose CMOS Logic Output", 2 GPO2 (out) "General-Purpose CMOS Logic Output", 3 GPO3 (out) "General-Purpose CMOS Logic Output", 4 GPO4 (out) "General-Purpose CMOS Logic Output", 5 OVR (out) "Over Range Output (Active High)", 6 DGND (power) "Digital Ground", 7 ~{DCEN} (in) "DC Servo Enable (Active Low)", 8 0DB (in) "Unity Gain Enable (Active High)", 9 ZCEN (in) "Zero Crossing Detector Enable (Active High)", 10 SDI (in) "Serial Data Input", 11 ~{CS} (in) "Chip Select Input (Active Low)", 12 SCLK (in) "Serial Data Clock Input", 13 SDO (hiz) "Serial Data Output", 14 VD- (power) "-5V Digital Supply", 15 VA- (power) "-5V Analog Supply", 16 VOUT- (out) "Analog Output, Inverting", 17 VOUT+ (out) "Analog Output, Non-Inverting", 18 VA+ (power) "+5V Analog Supply", 19 VA+ (power) "+5V Analog Supply", 20 VA- (power) "-5V Analog Supply", 21 CS22 "DC Servo Capacitor #2, Terminal 2", 22 CS21 "DC Servo Capacitor #2, Terminal 1", 23 CS12 "DC Servo Capacitor #1, Terminal 2", 24 CS11 "DC Servo Capacitor #1, Terminal 1", 25 VCOMIN (in) "Common Mode Voltage Input, 0V to +2.5V", 26 VIN- (in) "Analog Input, Inverting", 27 VIN+ (in) "Analog Input, Noninverting", 28 AGND (power) "Analog Ground"

## PGA2500IDBRG4
designator U?
Gain Range: 0 dB, and 10 dB to 65 dB in 1 dB Steps, -40 to 85 degC, 28-pin SOP (DB28), Green (RoHS & no Sb/Br); Manufacturer: Texas Instruments; PartNumber: PGA2500IDBRG4; Equivalent Input Noise (EIN) withGain: 30dB(dB)=-128; Input Type: Fully Differential; Quiescent Current (+/-)(Typ)(mA): 30; SubFamily: Microphone Preamplifier; THD+N with Gain: 30dB(percent)=0.0004; Vmax(V): 5.25; Vmin(V): 4.75; DatasheetVersion: SBOS289A; PackageVersion: 4040065/E, 12/2001; PackageReference: DB28; PackageDescription: 28-Pin Plastic Small Outline, Body 10.2 X 5.3 mm, Pitch 0.65 mm; Supplier 1: Digi-Key; Supplier Part Number 1: PGA2500IDBRG4-ND; Supplier 2: Newark; Supplier Part Number 2: 73K9280; Supplier 3: Mouser; Supplier Part Number 3: 595-PGA2500IDBRG4; Eco-Plan: Green (RoHS & no Sb/Br); Gain Range(dB): 0dB, and 10dB to 65dB in 1dB steps; Mounting Technology: Surface Mount; Code_JEDEC: MO-150; ComponentLink1Description: Manufacturer URL; ComponentLink1URL: http://www.ti.com/; ComponentLink2Description: Datasheet; ComponentLink2URL: http://www.ti.com/general/docs/lit/getliterature.tsp?genericPartNumber=PGA2500&fileType=pdf; ComponentLink3Description: Package Specification; ComponentLink3URL: http://www.ti.com/lit/ml/msso002e/msso002e.pdf
footprint TI-DB28_N (SOP, 28-Leads, Body 10.2x5.3mm, Pitch 0.65mm, IPC Medium Density)
footprint TI-DB28_L (SOP, 28-Leads, Body 10.2x5.3mm, Pitch 0.65mm, IPC High Density)
footprint TI-DB28_M (SOP, 28-Leads, Body 10.2x5.3mm, Pitch 0.65mm, IPC Low Density)
pins: 1 GPO1 (out) "General-Purpose CMOS Logic Output", 2 GPO2 (out) "General-Purpose CMOS Logic Output", 3 GPO3 (out) "General-Purpose CMOS Logic Output", 4 GPO4 (out) "General-Purpose CMOS Logic Output", 5 OVR (out) "Over Range Output (Active High)", 6 DGND (power) "Digital Ground", 7 ~{DCEN} (in) "DC Servo Enable (Active Low)", 8 0DB (in) "Unity Gain Enable (Active High)", 9 ZCEN (in) "Zero Crossing Detector Enable (Active High)", 10 SDI (in) "Serial Data Input", 11 ~{CS} (in) "Chip Select Input (Active Low)", 12 SCLK (in) "Serial Data Clock Input", 13 SDO (hiz) "Serial Data Output", 14 VD- (power) "-5V Digital Supply", 15 VA- (power) "-5V Analog Supply", 16 VOUT- (out) "Analog Output, Inverting", 17 VOUT+ (out) "Analog Output, Non-Inverting", 18 VA+ (power) "+5V Analog Supply", 19 VA+ (power) "+5V Analog Supply", 20 VA- (power) "-5V Analog Supply", 21 CS22 "DC Servo Capacitor #2, Terminal 2", 22 CS21 "DC Servo Capacitor #2, Terminal 1", 23 CS12 "DC Servo Capacitor #1, Terminal 2", 24 CS11 "DC Servo Capacitor #1, Terminal 1", 25 VCOMIN (in) "Common Mode Voltage Input, 0V to +2.5V", 26 VIN- (in) "Analog Input, Inverting", 27 VIN+ (in) "Analog Input, Noninverting", 28 AGND (power) "Analog Ground"